# Altium footprint library MyLibrarySum.PcbLib: 208 footprints (part 10 of 13)
Each footprint in its own frame and in the unit in brackets; x right, y up, seen from the top. Pads: shape width x height; smd on the part's side, far side on the other; paste and mask are expansions set on the pad; w line width, h text height; cw(c..) or ccw(c..) is an arc to the next point about the centre after c.
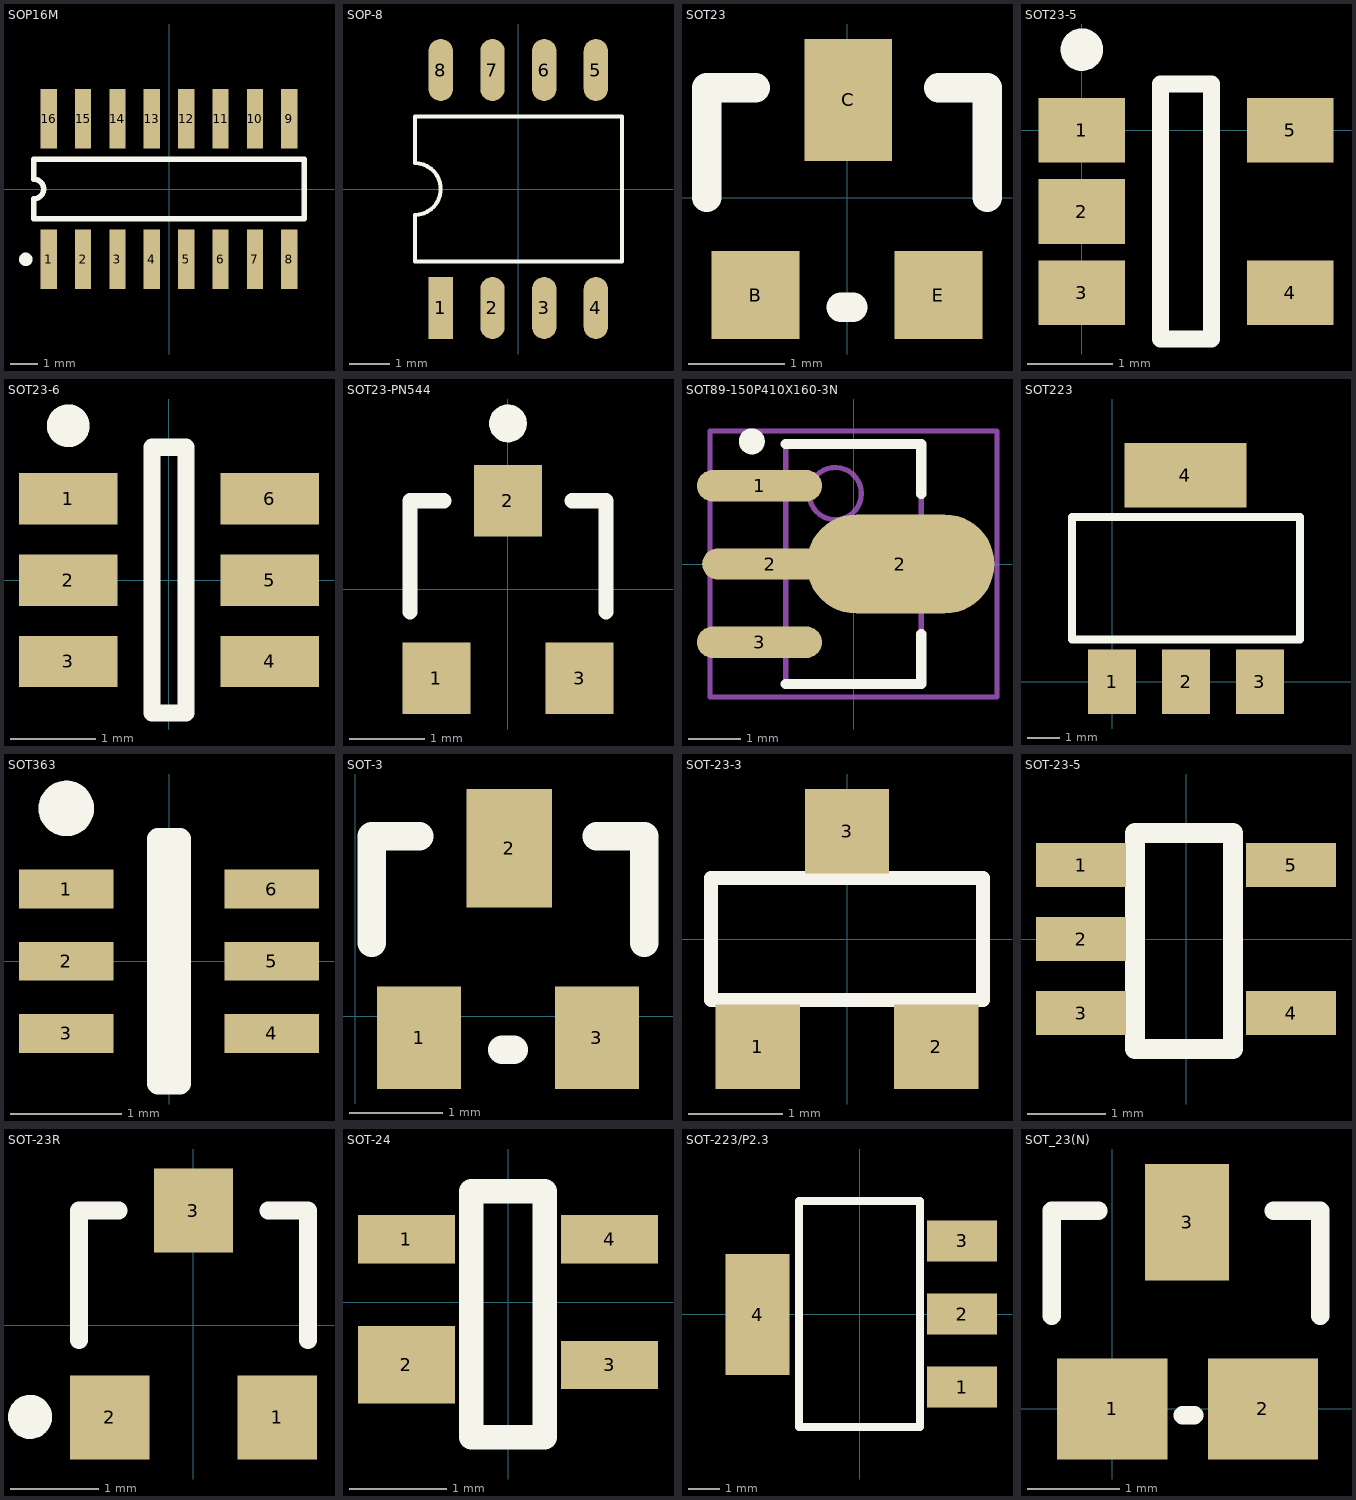
[diagram p9: the footprints below, top view; thin cyan lines are the x and y axes]

## SOP16M [mm]
pads (16):
  rect 0.6x2.2 smd: 1(-4.445,-2.6) 2(-3.175,-2.6) 3(-1.905,-2.6) 4(-0.635,-2.6) 5(0.635,-2.6) 6(1.905,-2.6) 7(3.175,-2.6) 8(4.445,-2.6) 9(4.445,2.6) 10(3.175,2.6) 11(1.905,2.6) 12(0.635,2.6) 13(-0.635,2.6) 14(-1.905,2.6) 15(-3.175,2.6) 16(-4.445,2.6)
Top Overlay:
  circle w0.25: c-5.295,-2.6 r0.125
  lines w0.2: -5,-1.1 5,-1.1 5,1.1 -5,1.1 -5,0.367 cw(c-5,0) -5,-0.367 -5,-1.1
3D body: height 1.95, standoff 0, extent -5.15,-3.048 5.15,3.008

## SOP-8 [mil]
height 59.06
pads (8):
  rect 23.62x60 smd: 1(-75,-115)
  oval 23.62x60 smd: 2(-25,-115) 3(25,-115) 4(75,-115) 5(75,115) 6(25,115) 7(-25,115) 8(-75,115)
Top Overlay:
  lines w3.94: -100,-70 -100,-25 ccw(c-100,0) -100,25 -100,70 100,70 100,-70 -100,-70
3D body: height 62.99, standoff 0, extent -100,-118.93 97.64,118.93

## SOT23 [mil]
pads (3):
  rect 36x36 smd: B(-37.5,-40) E(37.5,-40)
  rect 36x50 smd: C(0.5,40)
Top Overlay:
  lines w12: -57.5,0 -57.5,45 -37.5,45 ; -2.5,-45 2.5,-45 ; 37.5,45 57.5,45 57.5,0
3D body: height 39.37, standoff 0, extent -56.98,-52.13 57.98,40

## SOT23-5 [mil]
height 46.85
pads (5):
  rect 40x30 smd: 1(0,0) 2(0,-37.6) 3(0,-75.2) 4(96.46,-75.2) 5(96.46,0)
Top Overlay:
  circle w9.84: c0,37.4 r4.92
  lines w7.87: 36.42,-96.65 36.42,21.46 60.04,21.46 60.04,-96.65 36.42,-96.65
3D body: height 21.65, standoff -21.65, extent -8.43,-99.06 90,19.06

## SOT23-6 [mm]
height 1.45
pads (6):
  rect 1.15x0.6 smd: 1(-1.175,0.95) 2(-1.175,0) 3(-1.175,-0.95) 4(1.175,-0.95) 5(1.175,0) 6(1.175,0.95)
Top Overlay:
  circle w0.25: c-1.175,1.8 r0.125
  lines w0.2: -0.2,-1.55 0.2,-1.55 0.2,1.55 -0.2,1.55 -0.2,-1.55
3D body: height 1.09, standoff 0, extent -1.251,-1.397 1.175,1.397

## SOT23-PN544 [mm]
height 1.1
pads (3):
  rect 0.9x0.95 smd: 1(-0.95,-1.175) 2(0,1.175) 3(0.95,-1.175)
Top Overlay:
  circle w0.25: c0,2.2 r0.125
  lines w0.2: -1.3,-0.3 -1.3,1.175 -0.85,1.175 ; 0.85,1.175 1.3,1.175 1.3,-0.3
3D body: height 1.3, standoff 0, extent -1.476,-1.5 1.524,1.5

## SOT89-150P410X160-3N [mm] "SOT89, 3-Leads, Body 4.5x2.4mm (max), Pitch 1.50mm, Lead Span 4.1mm, IPC Medium Density"
height 1.6
pads (4):
  oval 2.4x0.6 smd: 1(-1.8,1.5) 3(-1.8,-1.5)
  oval 2.6x0.6 smd: 2(-1.6,0)
  oval 3.6x1.9 smd: 2(0.9,0)
Top Overlay:
  circle w0.25: c-1.95,2.35 r0.125
  lines w0.2: -1.3,-2.3 1.3,-2.3 1.3,-1.35 ; -1.3,2.3 1.3,2.3 1.3,1.35
Mechanical 13:
  circle w0.1: c-0.35,1.35 r0.5
  lines w0.1: -1.3,-2.3 1.3,-2.3 1.3,2.3 -1.3,2.3 -1.3,-2.3
Mechanical 15:
  lines w0.1: -0.5,0 0.5,0 ; 0,-0.5 0,0.5 ; -2.75,-2.55 2.75,-2.55 2.75,2.55 -2.75,2.55 -2.75,-2.55
3D body: height 1.6, standoff 0, extent -1.3,-2.3 1.3,2.3

## SOT223 [mil]
pads (4):
  rect 59x79 smd: 1(0,0) 2(90.55,0) 3(181.1,0)
  rect 150x79 smd: 4(89.88,253.54)
Top Overlay:
  lines w10: -49.45,52 -49.45,202 230.55,202 230.55,52 -49.45,52
3D body: height 32.97, standoff -32.97, extent -40,3.54 215.9,276.46

## SOT363 [mm]
height 1.1
pads (6):
  rect 0.85x0.35 smd: 1(-0.925,0.65) 2(-0.925,0) 3(-0.925,-0.65) 4(0.925,-0.65) 5(0.925,0) 6(0.925,0.65)
Top Overlay:
  circle w0.25: c-0.925,1.375 r0.125
  lines w0.2: -0.1,-1.1 -0.1,1.1 0.1,1.1 0.1,-1.1 -0.1,-1.1
3D body: height 1.1, standoff 0.1, extent -0.675,-1.1 0.675,1.1

## SOT-3 [mil]
pads (3):
  rect 35.43x43.31 smd: 1(27,-9) 3(102,-9)
  rect 36x50 smd: 2(65,71)
Top Overlay:
  lines w12: 7,31 7,76 27,76 ; 62,-14 67,-14 ; 102,76 122,76 122,31
3D body: height 39.57, standoff 0, extent 7.91,-10 122.09,83.31

## SOT-23-3 [mm]
height 0.38
pads (3):
  rect 0.9x0.9 smd: 1(-0.95,-1.15) 2(0.95,-1.15) 3(0,1.15)
Top Overlay:
  lines w0.15: -1.45,-0.65 -1.45,0.65 1.45,0.65 1.45,-0.65 -1.45,-0.65
3D body: height 1.2, standoff 0, extent -1.45,-1.4 1.45,1.4

## SOT-23-5 [mil]
pads (5):
  rect 45x22 smd: 1(-52.5,37) 2(-52.5,0) 3(-52.5,-37) 4(52.5,-37) 5(52.5,37)
Top Overlay:
  lines w10: -25.5,51 -25.5,-55 22.5,-55 ; -25.5,53 22.5,53 ; 23.5,-55 23.5,53
3D body: height 42.79, standoff -0.51, extent -56.67,-57.11 53.58,57.04

## SOT-23R [mm] "n/pmos"
pads (3):
  rect 0.9x0.95 smd: 1(0.95,-1.048) 2(-0.95,-1.048) 3(0,1.302)
Top Overlay:
  circle w0.25: c-1.856,-1.041 r0.125
  lines w0.2: -1.3,-0.173 -1.3,1.302 -0.85,1.302 ; 0.85,1.302 1.3,1.302 1.3,-0.173
3D body: height 1.3, standoff 0, extent -1.5,-1.349 1.5,1.651

## SOT-24 [mm]
pads (4):
  rect 1x0.5 smd: 1(-1.05,0.65) 3(1.05,-0.65) 4(1.05,0.65)
  rect 1x0.8 smd: 2(-1.05,-0.65)
Top Overlay:
  lines w0.254: -0.381,-1.397 -0.381,1.143 0.381,1.143 0.381,-1.397 -0.381,-1.397

## SOT-223/P2.3 [mm]
height 1.78
pads (4):
  rect 2.2x1.3 smd: 1(3.22,-2.3) 2(3.22,0) 3(3.22,2.3)
  rect 2.007x3.81 smd: 4(-3.22,-0.017)
Top Overlay:
  lines w0.254: -1.911,-3.556 1.899,-3.556 1.899,3.556 -1.911,3.556 -1.911,-3.556
3D body: height 1.65, standoff -0.03, extent -3.573,-3.255 3.387,3.245

## SOT_23(N) [mm]
pads (3):
  rect 1.2x1.1 smd: 1(0,0) 2(1.64,0)
  rect 0.914x1.27 smd: 3(0.815,2.032)
Top Overlay:
  lines w0.2: -0.658,1.016 -0.658,2.159 -0.15,2.159 ; 0.765,-0.068 0.892,-0.068 ; 1.755,2.159 2.263,2.159 2.263,1.016
3D body: height 1.3, standoff 0, extent -0.685,-0.484 2.315,2.516